# Altium footprint library BOARDS.PcbLib: 27 footprints (part 2 of 2)
Each footprint in its own frame and in the unit in brackets; x right, y up, seen from the top. Pads: shape width x height; smd on the part's side, far side on the other; paste and mask are expansions set on the pad; w line width, h text height; cw(c..) or ccw(c..) is an arc to the next point about the centre after c.
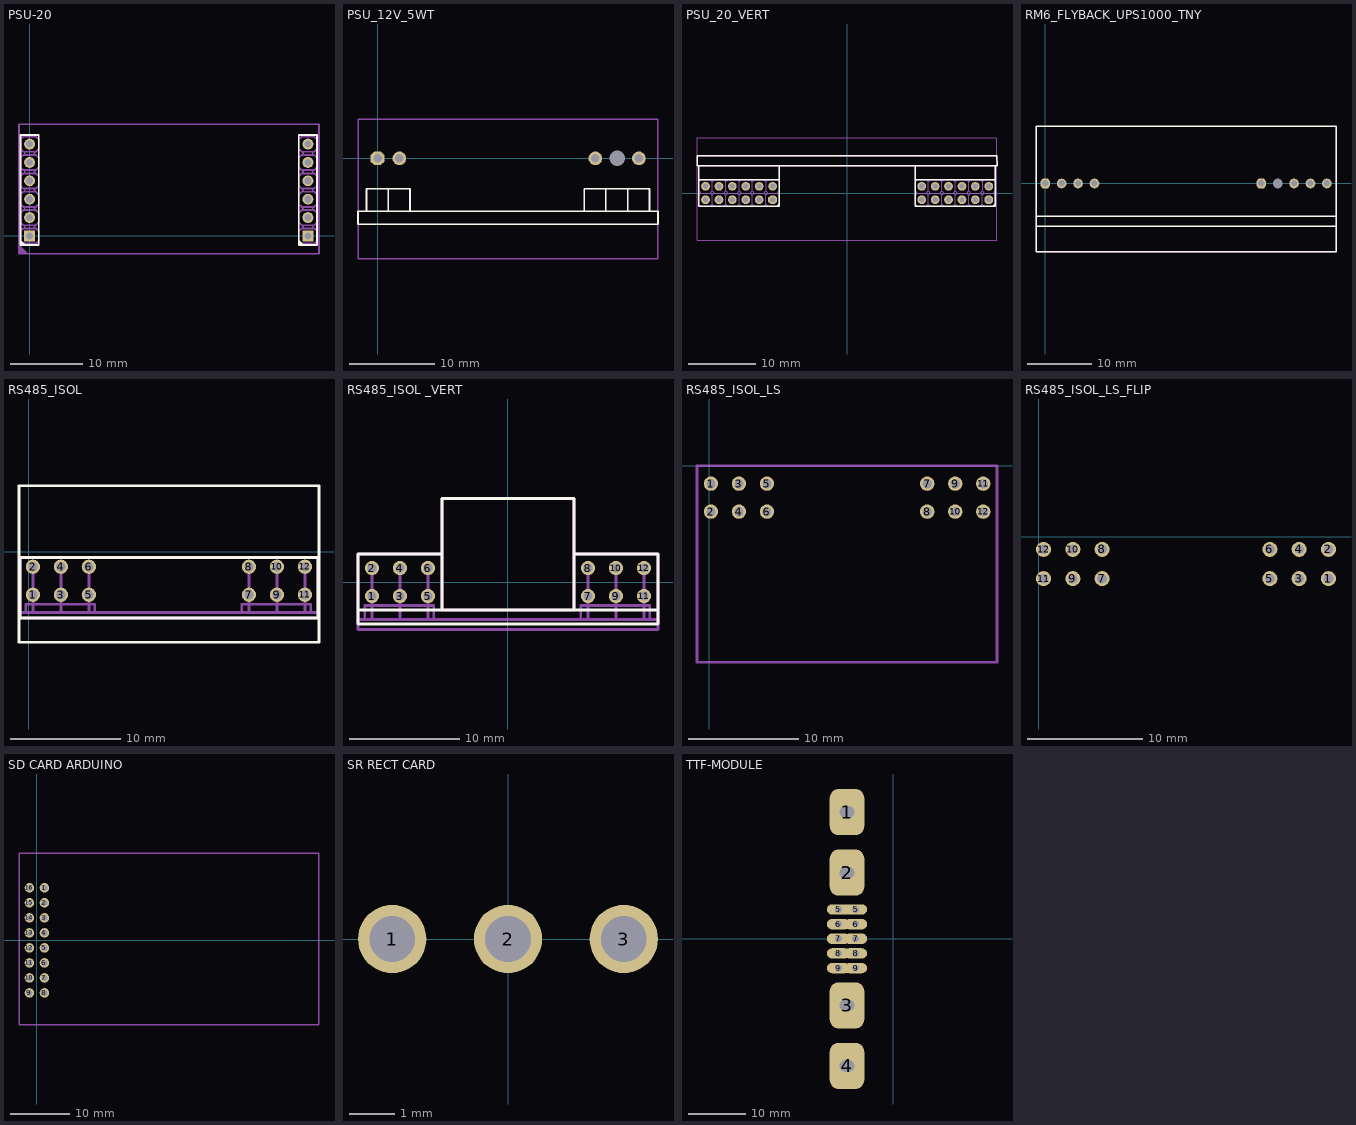
[diagram p1: the footprints below, top view; thin cyan lines are the x and y axes]

## PSU-20 [mm]
pads (12):
  rect 1.5x1.5 hole 1: X1_1(38.5,0) X2_1(0,0)
  round 1.5 hole 1: X1_2(38.5,2.54) X1_3(38.5,5.08) X1_4(38.5,7.62) X1_5(38.5,10.16) X1_6(38.5,12.7) X2_2(0,2.54) X2_3(0,5.08) X2_4(0,7.62) X2_5(0,10.16) X2_6(0,12.7)
Top Overlay:
  region: -0.5,-1.27 -1.27,-0.5 -1.27,-1.27
  region: 38,-1.27 37.23,-0.5 37.23,-1.27
  lines w0.254: -1.27,-1.27 -1.27,13.97 1.27,13.97 1.27,-1.27 -1.27,-1.27 ; 37.23,-1.27 37.23,13.97 39.77,13.97 39.77,-1.27 37.23,-1.27
Top Assembly:
  drawing of 281 lines, arcs and shapes, not listed
3D body "PSU-20.step": height 13, standoff -4.95, extent -1.47,-2.46 40.03,15.44

## PSU_12V_5WT [mm] "Плата источника питания 12В 5Вт"
height 20
pads (5):
  round 1.6 hole 1: X1_1(25.4,0) X1_3(30.48,0) X2_2(2.54,0)
  round 1.6 hole 1.8: X1_2(27.94,0)
  oct 1.6x1.6 hole 1: X2_1(0,0)
Top Overlay:
  lines w0.2: -1.306,-6.184 -1.306,-3.559 1.234,-3.559 ; 1.234,-6.184 1.234,-3.559 ; 3.774,-6.184 3.774,-3.559 1.234,-3.559 ; 24.094,-6.184 24.094,-3.559 26.634,-3.559 ; 31.714,-6.184 31.714,-3.559 29.174,-3.559 ; 26.634,-3.559 26.634,-6.184 26.634,-3.559 ; 26.634,-3.559 29.174,-3.559 ; 26.634,-3.559 29.174,-3.559 ; 29.174,-3.559 29.174,-6.184 29.174,-3.559 ; -2.286,-7.684 32.714,-7.684 32.714,-6.184 -2.286,-6.184 -2.286,-7.684
Top Assembly:
  lines w0.15: -2.286,-11.702 -2.286,4.548 32.714,4.548 32.714,-11.702 -2.286,-11.702
3D body "tny26x_ps_bridgeless_pfc_v1.step": height 31.05, standoff -5.45, extent -2.286,-11.684 32.714,4.566

## PSU_20_VERT [mm]
pads (24):
  oct 1.3x1.3 hole 0.8: X1_1(-11.125,-1) X2_1(21.125,-1)
  round 1.3 hole 0.8: X1_2(-11.125,1) X1_3(-13.125,-1) X1_4(-13.125,1) X1_5(-15.125,-1) X1_6(-15.125,1) X1_7(-17.125,-1) X1_8(-17.125,1) X1_9(-19.125,-1) X1_10(-19.125,1) X1_11(-21.125,-1) X1_12(-21.125,1) X2_2(21.125,1) X2_3(19.125,-1) X2_4(19.125,1) X2_5(17.125,-1) X2_6(17.125,1) X2_7(15.125,-1) X2_8(15.125,1) X2_9(13.125,-1) X2_10(13.125,1) X2_11(11.125,-1) X2_12(11.125,1)
Top Overlay:
  lines w0.2: -21.852,-2 -10.125,-2 ; -10.125,2 -22.125,2 -22.125,-2 ; -22.398,4.064 -22.125,4.064 ; -22.398,4.064 -22.398,5.564 22.352,5.564 22.352,4.064 -22.398,4.064 ; -22.125,-2 -10.425,-2 ; -22.125,-2 -22.125,4.064 ; -22.125,4.064 -10.125,4.064 -10.125,-2 ; -10.425,-2 -10.125,-1.7 ; -10.425,-2 -10.125,-2 ; -10.125,-2 -10.125,-1.7 ; -10.125,-1.7 -10.125,-1.7 ; 10.125,-2 21.825,-2 ; 10.125,-2 10.125,2 22.125,2 22.125,-2 ; 10.125,-2 10.125,4.064 22.125,4.064 22.125,-2 ; 21.825,-2 22.125,-1.7 ; 21.825,-2 22.125,-2 ; 22.125,-2 22.125,-1.7 ; 22.125,-1.7 22.125,-1.7
Top Assembly:
  drawing of 224 lines, arcs and shapes, not listed
3D body "PSU-20.step": height 20.05, standoff -3.7, extent -22.398,-7.054 22.352,8.246

## RM6_FLYBACK_UPS1000_TNY [mm] "Плата сопряжения"
height 35
pads (9):
  oct 1.5x1.5 hole 1: X1_1(33.48,0) X2_1(0,0)
  round 0 hole 1.5 unplated: X1_2(36.02,0)
  round 1.5 hole 1: X1_3(38.56,0) X1_4(41.1,0) X1_5(43.64,0) X2_2(2.54,0) X2_3(5.08,0) X2_4(7.62,0)
Top Overlay:
  lines w0.2: -1.44,-6.604 45.06,-6.604 ; -1.44,-5.08 45.06,-5.08 ; -1.44,-10.61 45.06,-10.61 45.06,8.89 -1.44,8.89 -1.44,-10.61
Top Assembly:
  lines w0.15: -1.44,-6.604 45.06,-6.604 ; -1.44,-5.08 45.06,-5.08 ; -1.44,-10.61 45.06,-10.61 45.06,8.89 -1.44,8.89 -1.44,-10.61
3D body "AC_DC_PROJECT.step": height 24.05, standoff -5.8, extent -1.44,-10.66 45.06,8.89

## RS485_ISOL [mm]
pads (12):
  round 1.3 hole 0.85: 1(0.4,-3.89) 2(0.4,-1.35) 3(2.94,-3.89) 4(2.94,-1.35) 5(5.48,-3.89) 6(5.48,-1.35) 7(20.01,-3.89) 8(20.01,-1.35) 9(22.55,-3.89) 10(22.55,-1.35) 11(25.09,-3.89) 12(25.09,-1.35)
Top Overlay:
  lines w0.254: -0.865,-8.2 26.365,-8.2 26.365,6 -0.865,6 -0.865,-8.2 ; -0.75,-6 -0.75,-0.5 26.25,-0.5 26.25,-6 -0.75,-6
Top Assembly:
  lines w0.25: -0.75,-5.5 26.25,-5.5 ; -0.25,-5.5 -0.25,-4.75 0.4,-4.75 5.48,-4.75 6,-4.75 6,-5.5 ; 0.4,-5.5 0.4,-2 ; 2.94,-5.5 2.94,-2 ; 5.48,-5.5 5.48,-2 ; 19.36,-5.5 19.36,-4.75 20.01,-4.75 25.09,-4.75 25.61,-4.75 25.61,-5.5 ; 20.01,-5.5 20.01,-2 ; 22.55,-5.5 22.55,-2 ; 25.09,-5.5 25.09,-2 ; -0.75,-6 26.25,-6 26.25,-0.5 -0.75,-0.5 -0.75,-6
3D body "RS485_ISOL.step": height 23.25, standoff -2.89, extent -0.865,-8.2 26.365,6

## RS485_ISOL _VERT [mm]
pads (12):
  round 1.3 hole 0.85: 1(-12.345,-1.27) 2(-12.345,1.27) 3(-9.805,-1.27) 4(-9.805,1.27) 5(-7.265,-1.27) 6(-7.265,1.27) 7(7.265,-1.27) 8(7.265,1.27) 9(9.805,-1.27) 10(9.805,1.27) 11(12.345,-1.27) 12(12.345,1.27)
Top Overlay:
  lines w0.254: -13.615,2.54 -13.615,-3.81 13.62,-3.81 13.62,2.54 5.995,2.54 13.615,2.54 13.615,-2.54 5.995,-2.54 ; -13.615,2.54 -5.995,2.54 ; -13.615,2.54 -5.995,2.54 ; -13.615,2.54 -13.615,-2.54 -5.995,-2.54 ; -5.995,-2.54 5.995,-2.54 ; -5.995,-2.54 -5.995,2.54 ; -5.995,2.54 -5.995,7.596 -0.939,7.596 5.995,7.596 5.995,-2.54
Top Assembly:
  lines w0.25: -13.615,-3.388 13.505,-3.388 ; -12.995,-3.388 -12.995,-2.13 -12.345,-2.13 -7.265,-2.13 -6.745,-2.13 -6.745,-3.388 ; -12.345,-3.388 -12.345,0.62 ; -9.805,-3.388 -9.805,0.62 ; -7.265,-3.388 -7.265,0.62 ; 6.615,-3.388 6.615,-2.13 7.265,-2.13 12.345,-2.13 12.865,-2.13 12.865,-3.388 ; 7.265,-3.388 7.265,0.62 ; 9.805,-3.388 9.805,0.62 ; 12.345,-3.388 12.345,0.62 ; -5.995,2.54 -5.995,-2.54 -0.915,-2.54 0.915,-2.54 5.995,-2.54 5.995,2.54 ; -5.995,2.54 -13.615,2.54 -13.615,-4.318 13.62,-4.318 13.62,2.54 5.995,2.54 ; -5.995,2.54 -5.995,7.596 -0.915,7.596 0.915,7.596 5.995,7.596 5.995,2.54
3D body "RS485_ISOL.step": height 20.35, standoff -5.96, extent -13.615,-6.604 13.615,7.596

## RS485_ISOL_LS [mm]
pads (12):
  round 1.3 hole 0.85: 1(0.15,-1.61) 2(0.15,-4.15) 3(2.69,-1.61) 4(2.69,-4.15) 5(5.23,-1.61) 6(5.23,-4.15) 7(19.76,-1.61) 8(19.76,-4.15) 9(22.3,-1.61) 10(22.3,-4.15) 11(24.84,-1.61) 12(24.84,-4.15)
Top Assembly:
  lines w0.25: -1.115,-17.8 -1.115,0 26.092,0 26.092,-17.8 -1.115,-17.8
3D body "1.step": height 15.2, standoff -3.91, extent -1.115,-17.8 26.115,0

## RS485_ISOL_LS_FLIP [mm]
pads (12):
  round 1.3 hole 0.85: 1(25.1,-3.64) 2(25.1,-1.1) 3(22.56,-3.64) 4(22.56,-1.1) 5(20.02,-3.64) 6(20.02,-1.1) 7(5.49,-3.64) 8(5.49,-1.1) 9(2.95,-3.64) 10(2.95,-1.1) 11(0.41,-3.64) 12(0.41,-1.1)
3D body "1.step": height 14.2, standoff -4.91, extent -0.865,-17.05 26.365,0.75

## SD CARD ARDUINO [mm]
pads (16):
  round 1.6 hole 1: 1(1.27,8.89) 2(1.27,6.35) 3(1.27,3.81) 4(1.27,1.27) 5(1.27,-1.27) 6(1.27,-3.81) 7(1.27,-6.35) 8(1.27,-8.89) 9(-1.27,-8.89) 10(-1.27,-6.35) 11(-1.27,-3.81) 12(-1.27,-1.27) 13(-1.27,1.27) 14(-1.27,3.81) 15(-1.27,6.35) 16(-1.27,8.89)
Top Assembly:
  lines w0.25: -3.03,-14.27 47.72,-14.27 47.72,14.73 -3.03,14.73 -3.03,-14.27
3D body "User Library-ArduinoSDCardModule1.step": height 7, standoff -5.5, extent -3.073,-14.469 47.506,14.531

## SR RECT CARD [mm]
pads (3):
  round 1.5 hole 1: 1(-2.54,0) 2(0,0) 3(2.54,0)
3D body "NCP4308.step": height 31.78, standoff -4.04, extent -6.25,-4.3 7.276,6.075

## TTF-MODULE [mm]
pads (14):
  rrect50% 6x8 hole 2 slot 2.5 at 0 deg: 1(-8,21.96) 2(-8,11.46) 3(-8,-11.54) 4(-8,-22.04)
  oval 4x1.8 hole 1.2: 5(-9.5,5.08) 5(-6.5,5.08) 6(-9.5,2.54) 6(-6.5,2.54) 7(-9.5,0) 7(-6.5,0) 8(-9.5,-2.54) 8(-6.5,-2.54) 9(-9.5,-5.08) 9(-6.5,-5.08)
Mechanical 2:
  lines w0.15: -10,-5.68 cw(c-10,-5.08) -10.6,-5.08 cw(c-10,-5.08) -10,-4.48 ; -10,-5.68 -9,-5.68 ; -10,-5.68 -9,-5.68 ; -10,-4.48 -9,-4.48 ; -10,-4.48 -9,-4.48 ; -10,-3.14 cw(c-10,-2.54) -10.6,-2.54 cw(c-10,-2.54) -10,-1.94 ; -10,-3.14 -9,-3.14 ; -10,-3.14 -9,-3.14 ; -10,-1.94 -9,-1.94 ; -10,-1.94 -9,-1.94 ; -10,-0.6 cw(c-10,0) -10.6,0 cw(c-10,0) -10,0.6 ; -10,-0.6 -9,-0.6 ; -10,-0.6 -9,-0.6 ; -10,0.6 -9,0.6 ; -10,0.6 -9,0.6 ; -10,1.94 cw(c-10,2.54) -10.6,2.54 cw(c-10,2.54) -10,3.14 ; -10,1.94 -9,1.94 ; -10,1.94 -9,1.94 ; -10,3.14 -9,3.14 ; -10,3.14 -9,3.14 ; -10,4.48 cw(c-10,5.08) -10.6,5.08 cw(c-10,5.08) -10,5.68 ; -10,4.48 -9,4.48 ; -10,4.48 -9,4.48 ; -10,5.68 -9,5.68 ; -10,5.68 -9,5.68 ; -9,-5.68 ccw(c-9,-5.08) -8.4,-5.08 ccw(c-9,-5.08) -9,-4.48 ; -9,-3.14 ccw(c-9,-2.54) -8.4,-2.54 ccw(c-9,-2.54) -9,-1.94 ; -9,-0.6 ccw(c-9,0) -8.4,0 ccw(c-9,0) -9,0.6 ; -9,1.94 ccw(c-9,2.54) -8.4,2.54 ccw(c-9,2.54) -9,3.14 ; -9,4.48 ccw(c-9,5.08) -8.4,5.08 ccw(c-9,5.08) -9,5.68 ; -7,-5.68 cw(c-7,-5.08) -7.6,-5.08 cw(c-7,-5.08) -7,-4.48 ; -7,-5.68 -6,-5.68 ; -7,-5.68 -6,-5.68 ; -7,-4.48 -6,-4.48 ; -7,-4.48 -6,-4.48 ; -7,-3.14 cw(c-7,-2.54) -7.6,-2.54 cw(c-7,-2.54) -7,-1.94 ; -7,-3.14 -6,-3.14 ; -7,-3.14 -6,-3.14 ; -7,-1.94 -6,-1.94 ; -7,-1.94 -6,-1.94 ; -7,-0.6 cw(c-7,0) -7.6,0 cw(c-7,0) -7,0.6 ; -7,-0.6 -6,-0.6 ; -7,-0.6 -6,-0.6 ; -7,0.6 -6,0.6 ; -7,0.6 -6,0.6 ; -7,1.94 cw(c-7,2.54) -7.6,2.54 cw(c-7,2.54) -7,3.14 ; -7,1.94 -6,1.94 ; -7,1.94 -6,1.94 ; -7,3.14 -6,3.14 ; -7,3.14 -6,3.14 ; -7,4.48 cw(c-7,5.08) -7.6,5.08 cw(c-7,5.08) -7,5.68 ; -7,4.48 -6,4.48 ; -7,4.48 -6,4.48 ; -7,5.68 -6,5.68 ; -7,5.68 -6,5.68 ; -6,-5.68 ccw(c-6,-5.08) -5.4,-5.08 ccw(c-6,-5.08) -6,-4.48 ; -6,-3.14 ccw(c-6,-2.54) -5.4,-2.54 ccw(c-6,-2.54) -6,-1.94 ; -6,-0.6 ccw(c-6,0) -5.4,0 ccw(c-6,0) -6,0.6 ; -6,1.94 ccw(c-6,2.54) -5.4,2.54 ccw(c-6,2.54) -6,3.14 ; -6,4.48 ccw(c-6,5.08) -5.4,5.08 ccw(c-6,5.08) -6,5.68 ; -9.5,-25.29 ccw(c-9,-25.29) -9,-25.79 -7,-25.79 ccw(c-7,-25.29) -6.5,-25.29 -6.5,-22.04 -6.5,-18.79 ccw(c-7,-18.79) -7,-18.29 -9,-18.29 ccw(c-9,-18.79) -9.5,-18.79 -9.5,-22.04 -9.5,-25.29 ; -9.5,-14.79 ccw(c-9,-14.79) -9,-15.29 -7,-15.29 ccw(c-7,-14.79) -6.5,-14.79 -6.5,-11.54 -6.5,-8.29 ccw(c-7,-8.29) -7,-7.79 -9,-7.79 ccw(c-9,-8.29) -9.5,-8.29 -9.5,-11.54 -9.5,-14.79 ; -9.5,8.21 ccw(c-9,8.21) -9,7.71 -7,7.71 ccw(c-7,8.21) -6.5,8.21 -6.5,11.46 -6.5,14.71 ccw(c-7,14.71) -7,15.21 -9,15.21 ccw(c-9,14.71) -9.5,14.71 -9.5,11.46 -9.5,8.21 ; -9.5,18.71 ccw(c-9,18.71) -9,18.21 -7,18.21 ccw(c-7,18.71) -6.5,18.71 -6.5,21.96 -6.5,25.21 ccw(c-7,25.21) -7,25.71 -9,25.71 ccw(c-9,25.21) -9.5,25.21 -9.5,21.96 -9.5,18.71
3D body "MosfetModule.step": height 40, standoff -6.04, extent -18.162,-25 -5.25,25